# Altium footprint library FujinLib.PcbLib: 106 footprints (part 7 of 7)
Each footprint in its own frame and in the unit in brackets; x right, y up, seen from the top. Pads: shape width x height; smd on the part's side, far side on the other; paste and mask are expansions set on the pad; w line width, h text height; cw(c..) or ccw(c..) is an arc to the next point about the centre after c.
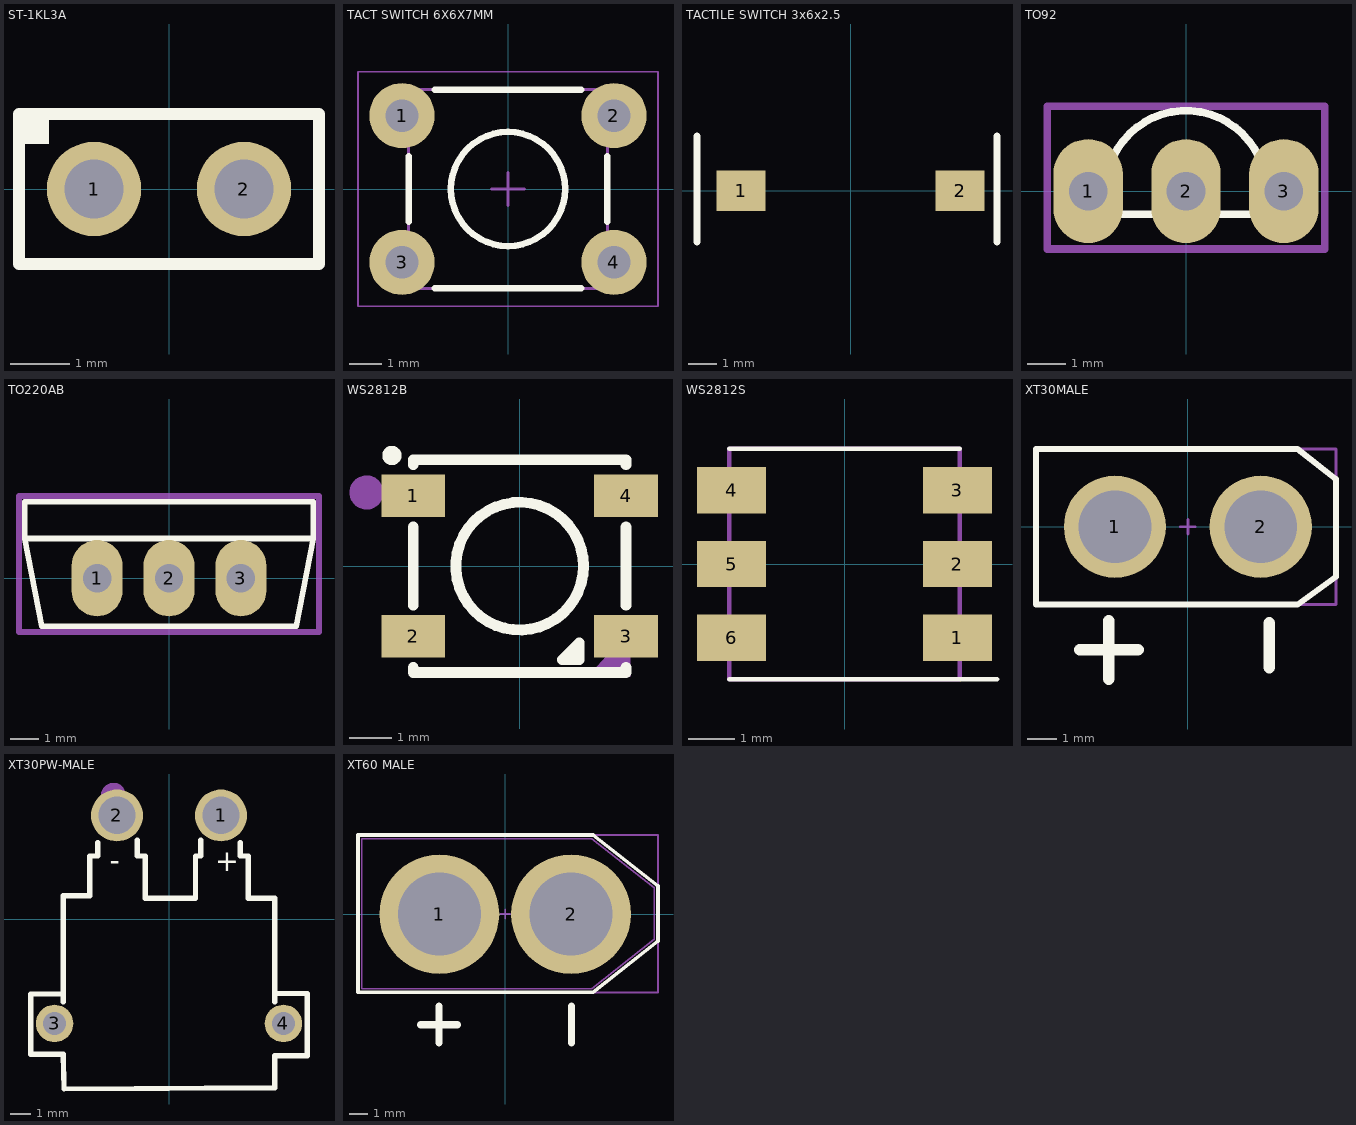
[diagram p6: the footprints below, top view; thin cyan lines are the x and y axes]

## ST-1KL3A [mm]
pads (2):
  round 1.6 hole 1: 1(-1.27,0) 2(1.27,0)
Top Overlay:
  rectangle: -2.54,0.762 -2.032,1.27
  lines w0.2: -2.54,-1.27 2.54,-1.27 2.54,1.27 -2.54,1.27 -2.54,-1.27
3D body "ST-1KL3A (3).STEP": height 5.68, standoff -2.5, extent -2.7,-0.254 2.7,11.071

## TACT SWITCH 6X6X7MM [mm] "Tactile Switch 6x6x7mm"
height 7
pads (4):
  round 2 hole 1: 1(-3.25,2.25) 2(3.25,2.25) 3(-3.25,-2.25) 4(3.25,-2.25)
Top Overlay:
  circle w0.2: c0,0 r1.75
  lines w0.2: -3.05,-1 -3.05,1 ; -2.25,-3.05 2.25,-3.05 ; -2.25,3.05 2.25,3.05 ; 3.05,-1 3.05,1
Mechanical 13:
  circle w0.1: c0,0 r1.75
  lines w0.1: -3.05,-3.05 -3.05,3.05 3.05,3.05 3.05,-3.05 -3.05,-3.05
Mechanical 15:
  lines w0.05: -4.6,-3.6 4.6,-3.6 4.6,3.6 -4.6,3.6 -4.6,-3.6
  lines w0.1: -0.5,0 0.5,0 ; 0,-0.5 0,0.5
Mechanical 29:
  text ".Designator" at 0,0 h2
3D body "TACT SWITCH 7MM.STEP": height 7, standoff -3.5, extent -3.95,-3.1 3.95,3.1

## TACTILE SWITCH 3x6x2.5 [mm] "Chip Capacitor; Body 1.6 x 0.8 mm (LxW typ)"
height 0.87
pads (2):
  rect 1.7x1.4 smd: 1(-3.8,0) 2(3.8,0)
Top Overlay:
  lines w0.254: -5.334,-1.778 -5.334,1.905 ; 5.08,-1.778 5.08,1.905
3D body: height 1.5, standoff 0, extent -4.953,-1.778 4.826,1.905
3D body: height 2.5, standoff 1.5, extent -1.778,-0.508 1.778,0.508

## TO92 [mm]
pads (3):
  oval 1.8x2.7 hole 1: 1(-2.54,0) 2(0,0) 3(2.54,0)
Top Overlay:
  lines w0.2: -2,-0.6 cw(c0,0) 2,-0.6 -2,-0.6
Mechanical 15:
  lines w0.1: -0.2,0.35 0.2,0.35 ; 0,0.15 0,0.55
  lines w0.2: -3.6,-1.5 3.6,-1.5 3.6,2.2 -3.6,2.2 -3.6,-1.5
Mechanical 29:
  text ".Designator" at -3.4,2.6 h0.5
  text "1" at -3.2,1.4 h0.5
3D body "TO92.STEP": height 6.83, standoff -1.9, extent -2.74,-0.568 2.74,2.04

## TO220AB [mm]
pads (3):
  oval 1.8x2.7 hole 1: 1(-2.54,0) 2(0,0) 3(2.54,0)
Top Overlay:
  lines w0.2: -5.1,1.4 -5.1,2.7 5.1,2.7 5.1,1.4 ; -5.1,1.4 5.1,1.4 ; -5.1,1.4 -4.5,-1.7 4.5,-1.7 5.1,1.4
Mechanical 15:
  lines w0.1: -0.2,0.5 0.2,0.5 ; 0,0.3 0,0.7
  lines w0.2: -5.3,-1.9 5.3,-1.9 5.3,2.9 -5.3,2.9 -5.3,-1.9
Mechanical 29:
  text ".Designator" at -5.1,3.3 h0.5
  text "1" at -3.9,-1.4 h0.5
3D body "TO220AB.STEP": height 19.34, standoff -1.98, extent -5.15,-1.778 5.15,2.732

## WS2812B [mm]
pads (4):
  rect 1.5x1 smd paste+0 mask+0.051: 1(-2.5,1.65) 2(-2.5,-1.65) 3(2.5,-1.65) 4(2.5,1.65)
Top Overlay:
  circle w0.254: c-0.001,0 r1.5
  circle w0.254: c-3,2.6 r0.1
  lines w0.254: -2.501,-2.38 -2.501,-2.5 2.499,-2.5 2.499,-2.38 ; -2.501,-0.92 -2.501,0.92 ; -2.501,2.38 -2.501,2.5 2.499,2.5 2.499,2.38 ; 2.499,-0.92 2.499,0.92 ; 0.999,-2.2 1.399,-2.2 1.399,-1.8 0.999,-2.2
Mechanical 15:
  circle w0.4: c-3.597,1.73 r0.2
  region: 2.6,-1.5 2.6,-2.6 1.6,-2.6
3D body "User Library-ws2812B-1.step": height 1.55, standoff -0.02, extent -2.7,-2.5 2.7,2.5

## WS2812S [mm]
pads (6):
  rect 1.5x1 smd: 1(2.45,-1.6) 2(2.45,0) 3(2.45,1.6) 4(-2.45,1.6) 5(-2.45,0) 6(-2.45,-1.6)
Top Overlay:
  lines w0.1: -2.5,-2.5 3.307,-2.5 ; -2.5,2.5 2.5,2.5
Mechanical 13:
  lines w0.1: -2.5,-2.5 2.5,-2.5 2.5,2.5 -2.5,2.5 -2.5,-2.5
3D body "User Library-WS2812S_.step": height 1.6, standoff 0, extent -2.7,-2.475 2.7,2.475

## XT30MALE [mm] "XT60 MALE"
height 16.2
pads (2):
  round 3.5 hole 2.5: 1(-2.5,0) 2(2.5,0)
Top Overlay:
  lines w0.2: -5.207,-2.667 3.763,-2.667 5.08,-1.715 5.08,1.633 3.763,2.667 -5.207,2.667 -5.207,-2.667
  lines w0.4: -3.711,-4.222 -1.711,-4.222 ; -2.711,-5.222 -2.711,-3.222 ; 2.794,-4.826 2.794,-3.302
Mechanical 13:
  lines w0.1: -5.207,-2.667 3.834,-2.667 5.08,-1.686 5.08,1.632 3.765,2.667 -5.207,2.667 -5.207,-2.667
Mechanical 15:
  lines w0.1: -0.25,0 0.25,0 ; 0,-0.25 0,0.25 ; -5.207,-2.667 5.08,-2.667 5.08,2.667 -5.207,2.667 -5.207,1.778 -5.207,-1.016 -5.207,-2.667
Mechanical 29:
  text ".Designator" at 0,0 h1
3D body "User Library-xt30upb-m.STEP": height 10.4, standoff -1, extent -5.1,-2.667 5.1,2.533

## XT30PW-MALE [mm]
pads (4):
  round 2.5 hole 1.8: 1(2.5,5) 2(-2.5,5)
  round 1.8 hole 1.1: 3(-5.5,-5) 4(5.5,-5)
Top Overlay:
  lines w0.254: -5.08,-3.95 -5.08,0.047 -5.08,1.143 -3.81,1.143 -3.81,3.048 -3.429,3.048 -3.429,3.683 ; -5.08,-3.585 -6.65,-3.585 -6.65,-6.48 -5.08,-6.48 -5.05,-8.15 5.08,-8.091 5.08,-6.549 ; -1.524,3.81 -1.524,3.048 -1.143,3.048 -1.143,1.016 1.27,1.016 1.27,3.048 1.524,3.048 1.524,3.81 ; 3.429,3.683 3.429,3.048 3.81,3.048 3.81,1.016 5.08,1.016 5.08,0.047 5.08,-3.95 ; 5.08,-6.55 6.65,-6.55 6.65,-3.559 5.08,-3.559
  text "-" at -2.848,2.367 h1
  text "+" at 2.232,2.319 h1
Mechanical 15:
  circle w0.6: c-2.667,5.969 r0.3
3D body "XT30PW-M--3DModel-STEP-1.STEP": height 5, standoff -2, extent -6.65,-7.903 6.65,6.047

## XT60 MALE [mm] "XT60 MALE"
height 16.2
pads (2):
  round 6.5 hole 4.5: 1(-3.575,0) 2(3.575,0)
Top Overlay:
  lines w0.2: -8,-4.25 -8,4.3 4.769,4.3 8.3,1.529 8.3,-1.465 4.75,-4.25 -8,-4.25
  lines w0.4: -4.6,-6 -2.6,-6 ; -3.6,-7 -3.6,-5 ; 3.6,-7 3.6,-5
Mechanical 13:
  lines w0.1: -7.8,-4.05 -7.8,4.1 4.7,4.1 8.1,1.425 8.1,-1.375 4.7,-4.05 -7.8,-4.05
Mechanical 15:
  lines w0.1: -0.25,0 0.25,0 ; 0,-0.25 0,0.25 ; -8,-4.25 -8,4.3 8.3,4.3 8.3,-4.25 -8,-4.25
Mechanical 29:
  text ".Designator" at 0,0 h1
3D body "XT60_Male.STEP": height 16.2, standoff -5, extent -7.8,-4.05 8.1,4.1